# Altium footprint library agh_racing_2018.PcbLib: 174 footprints (part 9 of 11)
Each footprint in its own frame and in the unit in brackets; x right, y up, seen from the top. Pads: shape width x height; smd on the part's side, far side on the other; paste and mask are expansions set on the pad; w line width, h text height; cw(c..) or ccw(c..) is an arc to the next point about the centre after c.
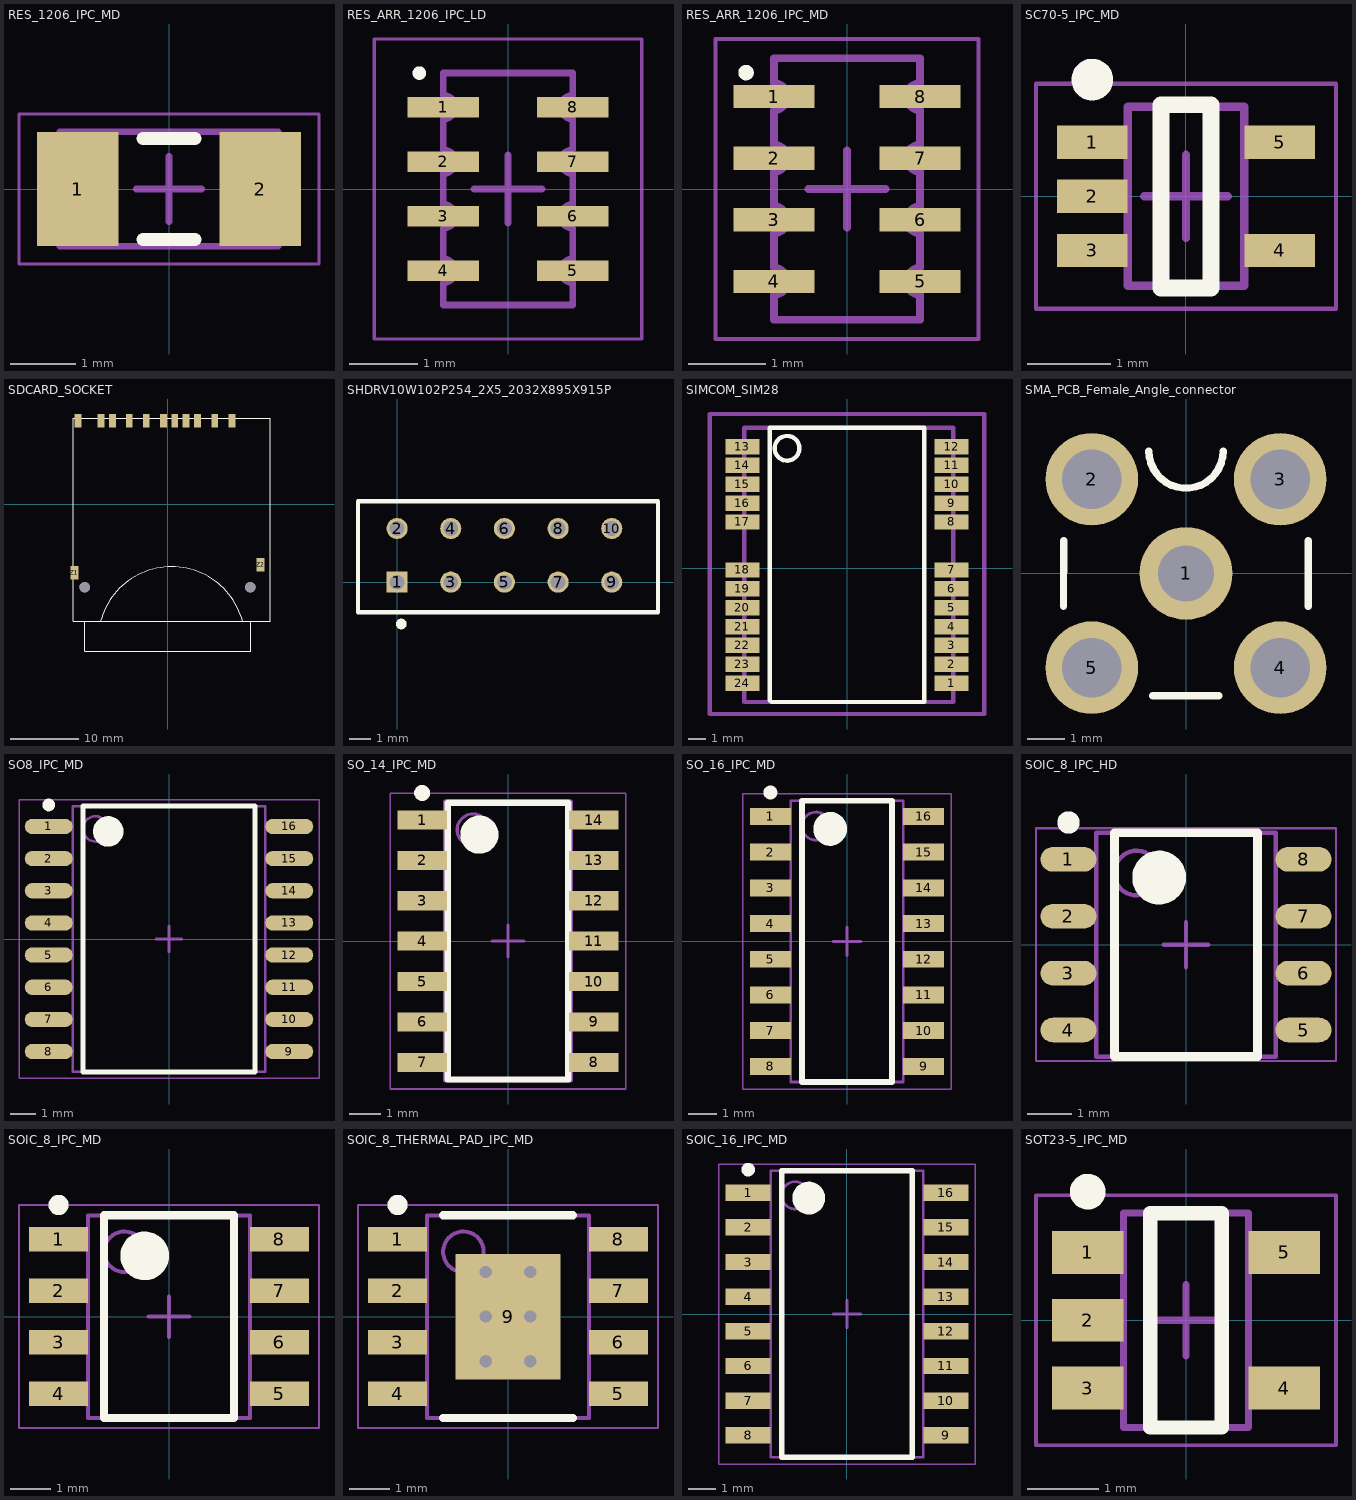
[diagram p8: the footprints below, top view; thin cyan lines are the x and y axes]

## RES_1206_IPC_MD [mm] "Chip Resistor, 2-Leads, 1206, IPC Medium Density"
height 0.71
pads (2):
  rect 1.25x1.75 smd: 1(-1.4,0) 2(1.4,0)
Top Overlay:
  lines w0.2: -0.4,-0.775 0.4,-0.775 ; -0.4,0.775 0.4,0.775
Mechanical 13:
  lines w0.1: -1.675,-0.875 1.675,-0.875 1.675,0.875 -1.675,0.875 -1.675,-0.875
Mechanical 15:
  lines w0.05: -2.3,-1.15 2.3,-1.15 2.3,1.15 -2.3,1.15 -2.3,-1.15
  lines w0.1: -0.5,0 0.5,0 ; 0,-0.5 0,0.5
3D body "RES_1206_IPC_MD.step": height 0.71, standoff 0, extent -1.675,-0.875 1.675,0.875

## RES_ARR_1206_IPC_LD [mm] "Chip Array, Concave, 8-Leads, Pitch 0,80mm,  Body 3,20x1,60mm,  IPC Low Density"
height 0.6
pads (8):
  rect 1.05x0.3 smd: 1(-0.95,1.2) 2(-0.95,0.4) 3(-0.95,-0.4) 4(-0.95,-1.2) 5(0.95,-1.2) 6(0.95,-0.4) 7(0.95,0.4) 8(0.95,1.2)
Top Overlay:
  circle w0.1: c-1.3,1.7 r0.05
Assembly Top:
  lines w0.1: -0.95,-1.7 0.95,-1.7 0.95,-1.375 cw(c0.95,-1.2) 0.95,-1.025 0.95,-0.575 cw(c0.95,-0.4) 0.95,-0.225 0.95,0.225 cw(c0.95,0.4) 0.95,0.575 0.95,1.025 cw(c0.95,1.2) 0.95,1.375 0.95,1.7 -0.95,1.7 -0.95,1.375 cw(c-0.95,1.2) -0.95,1.025 -0.95,0.575 cw(c-0.95,0.4) -0.95,0.225 -0.95,-0.225 cw(c-0.95,-0.4) -0.95,-0.575 -0.95,-1.025 cw(c-0.95,-1.2) -0.95,-1.375 -0.95,-1.7
Courtyard Top:
  lines w0.05: -1.96,-2.2 1.96,-2.2 1.96,2.2 -1.96,2.2 -1.96,-2.2
  lines w0.1: -0.5,0 0.5,0 ; 0,-0.5 0,0.5
3D body "CAC-80P320X160-8M.step": height 0.6, standoff 0, extent -0.95,-1.7 0.95,1.7

## RES_ARR_1206_IPC_MD [mm] "Chip Array, Concave, 8-Leads, Pitch 0,80mm,  Body 3,20x1,60mm,  IPC Medium Density"
height 0.6
pads (8):
  rect 1.05x0.3 smd: 1(-0.95,1.2) 2(-0.95,0.4) 3(-0.95,-0.4) 4(-0.95,-1.2) 5(0.95,-1.2) 6(0.95,-0.4) 7(0.95,0.4) 8(0.95,1.2)
Top Overlay:
  circle w0.1: c-1.312,1.513 r0.05
Assembly Top:
  lines w0.1: -0.95,-1.7 -0.95,-1.375 ccw(c-0.95,-1.2) -0.95,-1.025 -0.95,-0.575 ccw(c-0.95,-0.4) -0.95,-0.225 -0.95,0.225 ccw(c-0.95,0.4) -0.95,0.575 -0.95,1.025 ccw(c-0.95,1.2) -0.95,1.375 -0.95,1.7 0.95,1.7 0.95,1.375 ccw(c0.95,1.2) 0.95,1.025 0.95,0.575 ccw(c0.95,0.4) 0.95,0.225 0.95,-0.225 ccw(c0.95,-0.4) 0.95,-0.575 0.95,-1.025 ccw(c0.95,-1.2) 0.95,-1.375 0.95,-1.7 -0.95,-1.7
Courtyard Top:
  lines w0.05: -1.71,-1.95 -1.71,1.95 1.71,1.95 1.71,-1.95 -1.71,-1.95
  lines w0.1: -0.5,0 0.5,0 ; 0,-0.5 0,0.5
3D body "CAC-80P320X160-8N_MD.step": height 0.6, standoff 0, extent -0.95,-1.7 0.95,1.7

## SC70-5_IPC_MD [mm] "SOT23, 5-Leads, Body 1,30x2,10mm, Pitch 0,65mm, IPC Medium Density"
height 1.1
pads (5):
  rect 0.85x0.4 smd: 1(-1.125,0.65) 2(-1.125,0) 3(-1.125,-0.65) 4(1.125,-0.65) 5(1.125,0.65)
Top Overlay:
  circle w0.25: c-1.125,1.4 r0.125
  lines w0.2: -0.3,-1.1 0.3,-1.1 0.3,1.1 -0.3,1.1 -0.3,-1.1
Mechanical 13:
  lines w0.1: -0.7,-1.075 -0.7,1.075 0.7,1.075 0.7,-1.075 -0.7,-1.075
Mechanical 15:
  lines w0.05: -1.8,-1.35 -1.8,1.35 1.8,1.35 1.8,-1.35 -1.8,-1.35
  lines w0.1: -0.5,0 0.5,0 ; 0,-0.5 0,0.5
3D body "SC70-5_IPC_MD.step": height 1.1, standoff 0, extent -1.2,-1.075 1.2,1.075

## SDCARD_SOCKET [mm] "WR-CRD SD_Push and Push_with card detection_9 pins"
height 2.85
pads (15):
  rect 1x2 smd: 1(6.9,12.155) 2(4.4,12.155) 3(1.05,12.155) 4(-0.6,12.155) 5(-3.1,12.155) 6(-5.6,12.155) 7(-8.02,12.155) 8(-9.72,12.155) 9(9.4,12.155) CD(2.7,12.155) WP(-13.07,12.155)
  rect 1.2x2 smd: Z1(-13.6,-10.055) Z2(13.6,-8.855)
  round 1.5 hole 1.5 unplated: ""(-12.1,-12.155) ""(12.1,-12.155)
Top Overlay:
  lines w0.127: -12.1,-17.155 -12.1,-21.5 12.15,-21.5 12.15,-17.155 ; -9.8,-17.155 cw(c0.6,-19.915) 11,-17.155 ; -13.77,-17.155 15.03,-17.155 15.03,12.545 -13.77,12.545 -13.77,-17.155
3D body "693061010911.stp": height 3.06, standoff -0.49, extent -13.8,-17.16 15,12.74

## SHDRV10W102P254_2X5_2032X895X915P [mm]
height 9.15
pads (10):
  rect 1x1 hole 0.7: 1(0,0)
  round 1 hole 0.7: 2(0,2.54) 3(2.54,0) 4(2.54,2.54) 5(5.08,0) 6(5.08,2.54) 7(7.62,0) 8(7.62,2.54) 9(10.16,0) 10(10.16,2.54)
Top Overlay:
  circle w0.25: c0.2,-1.98 r0.125
  lines w0.2: -1.85,-1.425 12.35,-1.425 12.35,3.825 -1.85,3.825 -1.85,-1.425
Mechanical 20:
  circle w0.05: c0,0 r0.35
  lines w0.05: -0.5,0 0.5,0 ; 0,-0.5 0,0.5
3D body: height 6.5, standoff -2.5, extent 9.91,2.29 10.41,2.79
3D body: height 6.5, standoff -2.5, extent 7.37,2.29 7.87,2.79
3D body: height 6.5, standoff -2.5, extent 4.83,2.29 5.33,2.79
3D body: height 6.5, standoff -2.5, extent 2.29,2.29 2.79,2.79
3D body: height 6.5, standoff -2.5, extent -0.25,2.29 0.25,2.79
3D body: height 9, standoff -2.5, extent 9.91,-0.25 10.41,0.25
3D body: height 9, standoff -2.5, extent 7.37,-0.25 7.87,0.25
3D body: height 9, standoff -2.5, extent 4.83,-0.25 5.33,0.25
3D body: height 9, standoff -2.5, extent 2.29,-0.25 2.79,0.25
3D body: height 9, standoff -2.5, extent -0.25,-0.25 0.25,0.25
3D body: height 3, standoff 2.6, extent -1.125,-1.375 -1.125,-1.375
3D body: height 3, standoff 2.6, extent -1.875,-1.425 -1.875,-1.425
3D body: height 6.5, standoff 6, extent -0.25,2.29 0.25,4.29
3D body: height 6.5, standoff 6, extent 2.29,2.29 2.79,4.29
3D body: height 6.5, standoff 6, extent 4.83,2.29 5.33,4.29
3D body: height 6.5, standoff 6, extent 7.37,2.29 7.87,4.29
3D body: height 6.5, standoff 6, extent 9.91,2.29 10.41,4.29
3D body: height 9, standoff 8.5, extent -0.25,-0.25 0.25,4.29
3D body: height 9, standoff 8.5, extent 2.29,-0.25 2.79,4.29
3D body: height 9, standoff 8.5, extent 4.83,-0.25 5.33,4.29
3D body: height 9, standoff 8.5, extent 7.37,-0.25 7.87,4.29
3D body: height 9, standoff 8.5, extent 9.91,-0.25 10.41,4.29
3D body: height 12.1, standoff 3.15, extent -5,4.275 15.15,13.3
3D body: height 9.31, standoff -0.41, extent -4.1,4.025 -4.1,4.025

## SIMCOM_SIM28 [mm] "Modu³: GPS; GPIO, I2C, SPI, UART"
height 3
pads (24):
  rect 2x0.9 smd: 1(6.1,-6.7) 2(6.1,-5.6) 3(6.1,-4.5) 4(6.1,-3.4) 5(6.1,-2.3) 6(6.1,-1.2) 7(6.1,-0.1) 8(6.1,2.7) 9(6.1,3.8) 10(6.1,4.9) 11(6.1,6) 12(6.1,7.1) 13(-6.1,7.1) 14(-6.1,6) 15(-6.1,4.9) 16(-6.1,3.8) 17(-6.1,2.7) 18(-6.1,-0.1) 19(-6.1,-1.2) 20(-6.1,-2.3) 21(-6.1,-3.4) 22(-6.1,-4.5) 23(-6.1,-5.6) 24(-6.1,-6.7)
Top Overlay:
  circle w0.254: c-3.5,7 r0.721
  lines w0.254: -4.5,-7.7 -4.4,-7.8 4.5,-7.8 4.5,8.2 -4.5,8.2 -4.5,-7.7
Mechanical 13:
  lines w0.254: -6,-7.8 -6,8.2 6.2,8.2 6.2,-7.8 -6,-7.8
Mechanical 15:
  lines w0.254: -8,-8.5 8,-8.5 8,9 -8,9 -8,-8.5
3D body: height 2.4, standoff 0.8, extent -6,-7.8 6.2,8.2

## SMA_PCB_Female_Angle_connector [mm]
pads (5):
  round 2.5 hole 1.5: 1(0,0)
  round 2.5 hole 1.6: 2(-2.54,2.54) 3(2.54,2.54) 4(2.54,-2.54) 5(-2.54,-2.54)
Top Overlay:
  lines w0.2: -3.304,-0.889 -3.302,0.889 ; -1,3.3 ccw(c0,3.3) 1,3.3 ; -0.903,-3.302 0.889,-3.302 ; 3.299,-0.889 3.301,0.889
3D body "c-5-1814400-1-d-3d.stp": height 10.48, standoff -3.05, extent -3.163,-3.2 3.163,11

## SO8_IPC_MD [mm] "SOIC, 16-Leads, Body 10.30x7.50mm, Pitch 1.27mm, IPC Medium Density"
height 2.65
pads (16):
  oval 1.9x0.6 smd: 1(-4.75,4.445) 2(-4.75,3.175) 3(-4.75,1.905) 4(-4.75,0.635) 5(-4.75,-0.635) 6(-4.75,-1.905) 7(-4.75,-3.175) 8(-4.75,-4.445) 9(4.75,-4.445) 10(4.75,-3.175) 11(4.75,-1.905) 12(4.75,-0.635) 13(4.75,0.635) 14(4.75,1.905) 15(4.75,3.175) 16(4.75,4.445)
Top Overlay:
  circle w0.25: c-4.75,5.295 r0.125
  circle w0.6: c-2.4,4.25 r0.3
  lines w0.2: -3.4,-5.25 -3.4,5.25 3.4,5.25 3.4,-5.25 -3.4,-5.25
Mechanical 13:
  circle w0.1: c-2.9,4.35 r0.5
  lines w0.1: -3.8,-5.25 -3.8,5.25 3.8,5.25 3.8,-5.25 -3.8,-5.25
Mechanical 15:
  lines w0.05: -5.925,-5.5 -5.925,5.5 5.925,5.5 5.925,-5.5 -5.925,-5.5
  lines w0.1: -0.5,0 0.5,0 ; 0,-0.5 0,0.5
3D body "SO8_IPC_MD.step": height 2.65, standoff 0, extent -5.15,-5.25 5.15,5.25

## SO_14_IPC_MD [mm] "SOP, 14-Leads, Body 8,65x3,90mm, Pitch 1,27mm, IPC Medium Density"
height 1.75
pads (14):
  rect 1.55x0.6 smd: 1(-2.7,3.81) 2(-2.7,2.54) 3(-2.7,1.27) 4(-2.7,0) 5(-2.7,-1.27) 6(-2.7,-2.54) 7(-2.7,-3.81) 8(2.7,-3.81) 9(2.7,-2.54) 10(2.7,-1.27) 11(2.7,0) 12(2.7,1.27) 13(2.7,2.54) 14(2.7,3.81)
Top Overlay:
  circle w0.25: c-2.7,4.66 r0.125
  circle w0.6: c-0.9,3.35 r0.3
  lines w0.2: -1.9,-4.35 -1.9,4.35 1.9,4.35 1.9,-4.35 -1.9,-4.35
Mechanical 13:
  circle w0.1: c-1.1,3.5 r0.5
  lines w0.1: -2,-4.4 -2,4.4 2,4.4 2,-4.4 -2,-4.4
Mechanical 15:
  lines w0.05: -3.7,-4.65 -3.7,4.65 3.7,4.65 3.7,-4.65 -3.7,-4.65
  lines w0.1: -0.5,0 0.5,0 ; 0,-0.5 0,0.5
3D body "SOP14_MD_IPC.step": height 1.75, standoff 0, extent -3,-4.4 3,4.4

## SO_16_IPC_MD [mm] "SO, 16-Leads, Pitch 1,27mm, IPC Medium Density"
height 1.75
pads (16):
  rect 1.45x0.6 smd: 1(-2.725,4.445) 2(-2.725,3.175) 3(-2.725,1.905) 4(-2.725,0.635) 5(-2.725,-0.635) 6(-2.725,-1.905) 7(-2.725,-3.175) 8(-2.725,-4.445) 9(2.725,-4.445) 10(2.725,-3.175) 11(2.725,-1.905) 12(2.725,-0.635) 13(2.725,0.635) 14(2.725,1.905) 15(2.725,3.175) 16(2.725,4.445)
Top Overlay:
  circle w0.6: c-0.6,4 r0.3
  circle w0.25: c-2.725,5.295 r0.125
  lines w0.2: -1.6,-5 1.6,-5 1.6,5 -1.6,5 -1.6,-5
Mechanical 13:
  circle w0.1: c-1.1,4.1 r0.5
  lines w0.1: -2,-5 2,-5 2,5 -2,5 -2,-5
Mechanical 15:
  lines w0.05: -3.7,-5.25 3.7,-5.25 3.7,5.25 -3.7,5.25 -3.7,-5.25
  lines w0.1: -0.5,0 0.5,0 ; 0,-0.5 0,0.5
3D body "SO_16_IPC_MD.step": height 1.75, standoff 0, extent -3,-5 3,5

## SOIC_8_IPC_HD [mm] "SOIC, 8-Leads, Body 4.90x3.90mm, Pitch 1.27mm, IPC High Density"
height 1.75
pads (8):
  oval 1.25x0.55 smd: 1(-2.625,1.905) 2(-2.625,0.635) 3(-2.625,-0.635) 4(-2.625,-1.905) 5(2.625,-1.905) 6(2.625,-0.635) 7(2.625,0.635) 8(2.625,1.905)
Top Overlay:
  circle w0.6: c-0.6,1.5 r0.3
  circle w0.25: c-2.625,2.73 r0.125
  lines w0.2: -1.6,-2.5 1.6,-2.5 1.6,2.5 -1.6,2.5 -1.6,-2.5
Mechanical 13:
  circle w0.1: c-1.1,1.6 r0.5
  lines w0.1: -2,-2.5 2,-2.5 2,2.5 -2,2.5 -2,-2.5
Mechanical 15:
  lines w0.05: -3.35,-2.6 3.35,-2.6 3.35,2.6 -3.35,2.6 -3.35,-2.6
  lines w0.1: -0.5,0 0.5,0 ; 0,-0.5 0,0.5
3D body "SOIC_8_IPC_HD.step": height 1.75, standoff 0, extent -3,-2.5 3,2.5

## SOIC_8_IPC_MD [mm] "SOIC, 8-Leads, Pitch 1,27mm, IPC Medium Density"
height 1.75
pads (8):
  rect 1.45x0.6 smd: 1(-2.725,1.905) 2(-2.725,0.635) 3(-2.725,-0.635) 4(-2.725,-1.905) 5(2.725,-1.905) 6(2.725,-0.635) 7(2.725,0.635) 8(2.725,1.905)
Top Overlay:
  circle w0.25: c-2.725,2.755 r0.125
  circle w0.6: c-0.6,1.5 r0.3
  lines w0.2: -1.6,-2.5 -1.6,2.5 1.6,2.5 1.6,-2.5 -1.6,-2.5
Mechanical 13:
  circle w0.1: c-1.1,1.6 r0.5
  lines w0.1: -2,-2.5 -2,2.5 2,2.5 2,-2.5 -2,-2.5
Mechanical 15:
  lines w0.05: -3.7,-2.75 -3.7,2.75 3.7,2.75 3.7,-2.75 -3.7,-2.75
  lines w0.1: -0.5,0 0.5,0 ; 0,-0.5 0,0.5
3D body "SOIC_8_IPC_MD.step": height 1.75, standoff 0, extent -3,-2.5 3,2.5

## SOIC_8_THERMAL_PAD_IPC_MD [mm] "SOIC, 8-Leads, Thermal Pad 3,10x2,60mm, IPC Medium Density"
height 1.75
pads (9):
  rect 1.45x0.6 smd: 1(-2.725,1.905) 2(-2.725,0.635) 3(-2.725,-0.635) 4(-2.725,-1.905) 5(2.725,-1.905) 6(2.725,-0.635) 7(2.725,0.635) 8(2.725,1.905)
  rect 2.6x3.1 smd: 9(0,0)
via 0.55,1.1 diameter 0.9 hole 0.3
via -0.55,1.1 diameter 0.9 hole 0.3
via -0.55,0 diameter 0.9 hole 0.3
via -0.55,-1.1 diameter 0.9 hole 0.3
via 0.55,-1.1 diameter 0.9 hole 0.3
via 0.55,0 diameter 0.9 hole 0.3
Top Overlay:
  circle w0.25: c-2.725,2.755 r0.125
  lines w0.2: -1.6,-2.5 1.6,-2.5 ; -1.6,2.5 1.6,2.5
Mechanical 13:
  circle w0.1: c-1.1,1.6 r0.5
  lines w0.1: -2,-2.5 -2,2.5 2,2.5 2,-2.5 -2,-2.5
Mechanical 15:
  lines w0.05: -3.7,-2.75 -3.7,2.75 3.7,2.75 3.7,-2.75 -3.7,-2.75
  lines w0.1: -0.5,0 0.5,0 ; 0,-0.5 0,0.5
3D body "SOIC_8_THERMAL_PAD_IPC_MD.step": height 1.75, standoff 0, extent -3,-2.5 3,2.5

## SOIC_16_IPC_MD [mm] "SOIC, 16-Leads, Pitch 1,27mm, IPC Medium Density"
height 2
pads (16):
  rect 1.65x0.6 smd: 1(-3.625,4.445) 2(-3.625,3.175) 3(-3.625,1.905) 4(-3.625,0.635) 5(-3.625,-0.635) 6(-3.625,-1.905) 7(-3.625,-3.175) 8(-3.625,-4.445) 9(3.625,-4.445) 10(3.625,-3.175) 11(3.625,-1.905) 12(3.625,-0.635) 13(3.625,0.635) 14(3.625,1.905) 15(3.625,3.175) 16(3.625,4.445)
Top Overlay:
  circle w0.25: c-3.625,5.295 r0.125
  circle w0.6: c-1.4,4.25 r0.3
  lines w0.2: -2.4,-5.25 -2.4,5.25 2.4,5.25 2.4,-5.25 -2.4,-5.25
Mechanical 13:
  circle w0.1: c-1.9,4.35 r0.5
  lines w0.1: -2.8,-5.25 -2.8,5.25 2.8,5.25 2.8,-5.25 -2.8,-5.25
Mechanical 15:
  lines w0.05: -4.7,-5.5 -4.7,5.5 4.7,5.5 4.7,-5.5 -4.7,-5.5
  lines w0.1: -0.5,0 0.5,0 ; 0,-0.5 0,0.5
3D body "SOIC_16_IPC_MD.step": height 2, standoff 0, extent -3.9,-5.25 3.9,5.25

## SOT23-5_IPC_MD [mm] "SOT23, 5-Leads, Body 2,90x2,80mm, IPC Medium Density"
height 1.45
pads (5):
  rect 1x0.6 smd: 1(-1.375,0.95) 2(-1.375,0) 3(-1.375,-0.95) 4(1.375,-0.95) 5(1.375,0.95)
Top Overlay:
  circle w0.25: c-1.375,1.8 r0.125
  lines w0.2: -0.5,-1.5 0.5,-1.5 0.5,1.5 -0.5,1.5 -0.5,-1.5
Mechanical 13:
  lines w0.1: -0.875,-1.5 -0.875,1.5 0.875,1.5 0.875,-1.5 -0.875,-1.5
Mechanical 15:
  lines w0.05: -2.1,-1.75 -2.1,1.75 2.1,1.75 2.1,-1.75 -2.1,-1.75
  lines w0.1: -0.5,0 0.5,0 ; 0,-0.5 0,0.5
3D body "SOT23-5.step": height 1.45, standoff 0, extent -1.6,-1.5 1.6,1.5